# Altium footprint library SMD Passive.PcbLib: 136 footprints (part 4 of 9)
Each footprint in its own frame and in the unit in brackets; x right, y up, seen from the top. Pads: shape width x height; smd on the part's side, far side on the other; paste and mask are expansions set on the pad; w line width, h text height; cw(c..) or ccw(c..) is an arc to the next point about the centre after c.
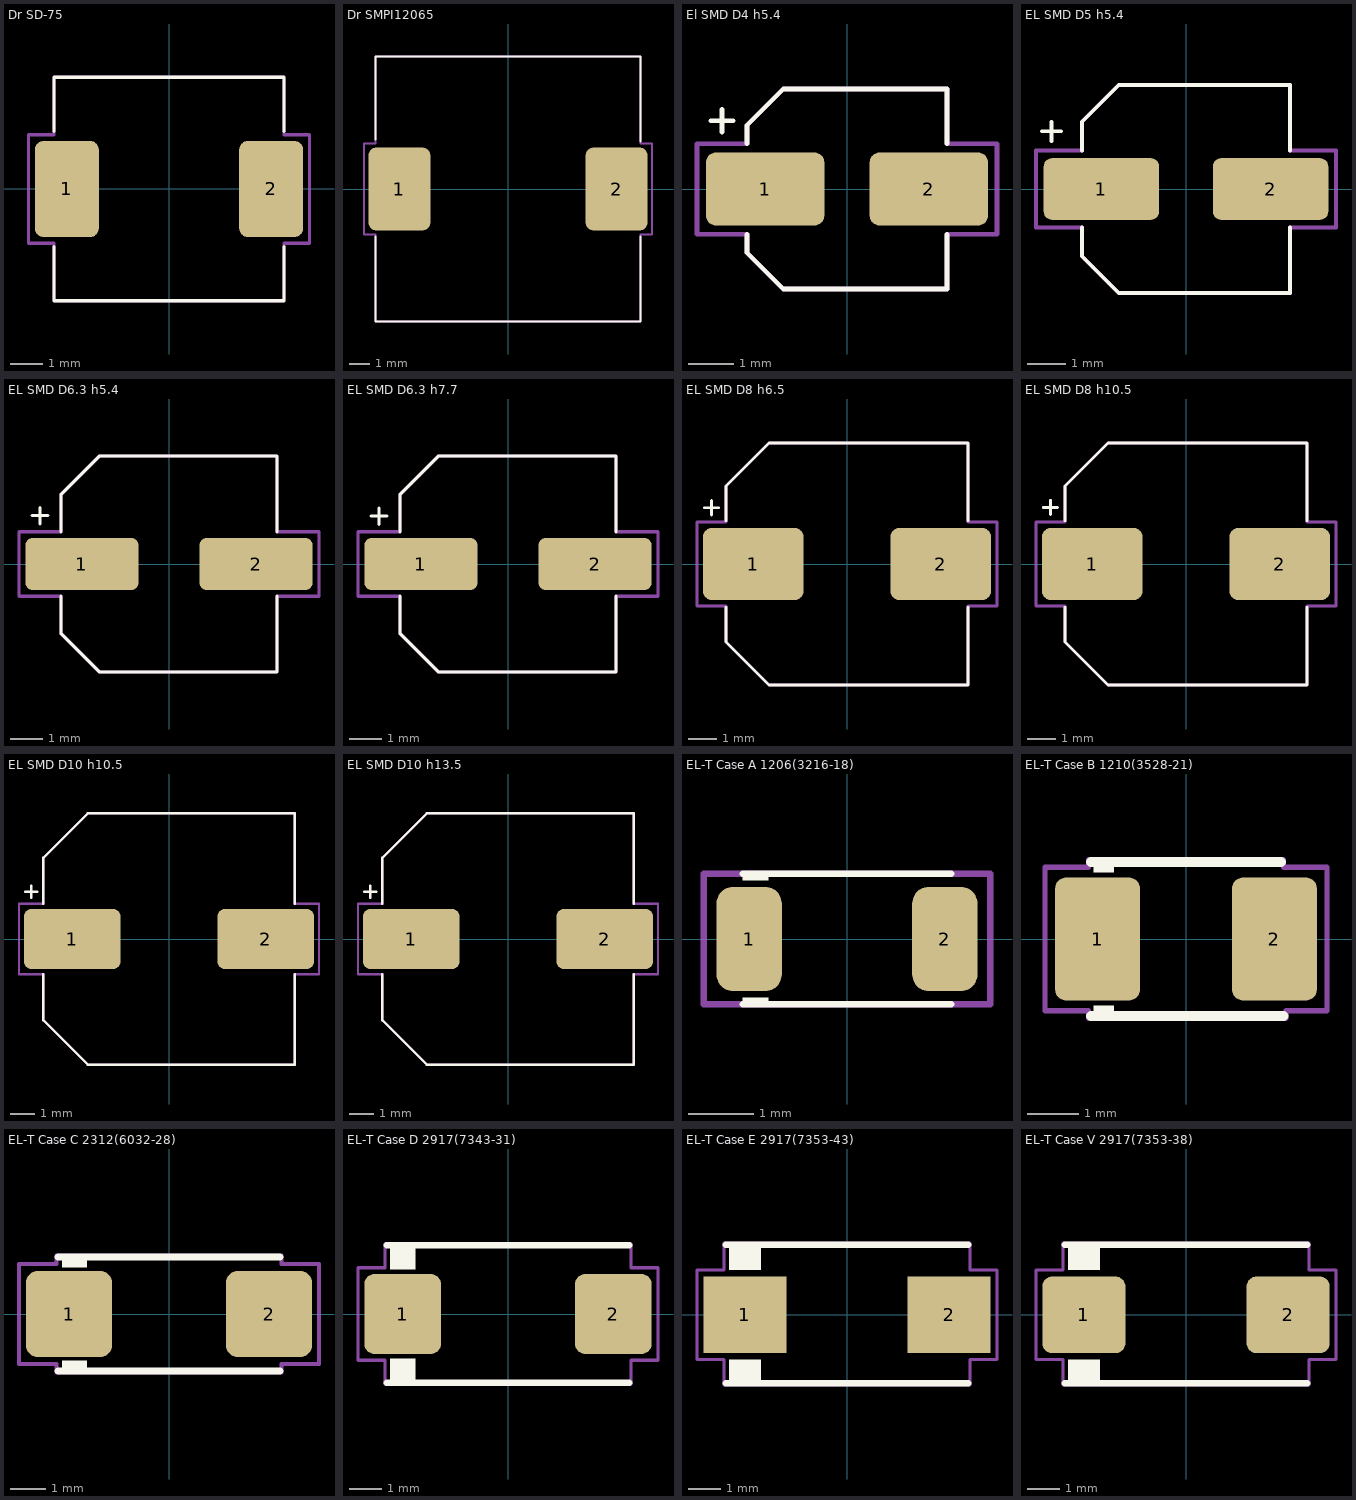
[diagram p3: the footprints below, top view; thin cyan lines are the x and y axes]

## Dr SD-75 [mm] "7.3x7.3x5mm"
height 5
pads (2):
  rrect25% 2x3 smd: 1(-3.2,0) 2(3.2,0)
Top Overlay:
  lines w0.1: -3.6,-1.8 -3.6,-3.5 3.6,-3.5 3.6,-1.8 ; -3.6,1.8 -3.6,3.5 3.6,3.5 3.6,1.8
Top Courtyard:
  lines w0.1: -3.6,3.494 -3.6,1.7 -4.4,1.7 -4.4,-1.7 -3.6,-1.7 -3.6,-3.5 3.6,-3.5 3.6,-1.7 4.4,-1.7 4.4,1.7 3.6,1.7 3.6,3.5 -3.6,3.5
3D body "Dr SMD SLF7045T.STEP": height 4.61, standoff 0, extent -3.6,-3.5 3.6,3.5

## Dr SMPI12065 [mm]
pads (2):
  rrect25% 3x4 smd: 1(-5.25,0) 2(5.25,0)
Top Overlay:
  lines w0.1: -6.4,-2.3 -6.4,-6.4 6.4,-6.4 6.4,-2.3 ; -6.4,2.4 -6.4,6.4 6.4,6.4 6.4,2.3
Top Courtyard:
  lines w0.1: -6.95,-2.2 -6.4,-2.2 -6.4,-6.4 6.4,-6.4 6.4,-2.2 6.95,-2.2 6.95,2.2 6.4,2.2 6.4,6.4 -6.4,6.4 -6.4,2.2 -6.95,2.2 -6.95,-2.2
3D body "AX02-30.STEP": height 5.99, standoff 0, extent -7.487,-6.639 7.487,6.655

## El SMD D4 h5.4 [mm]
height 5.4
pads (2):
  rrect25% 2.6x1.6 smd mask+0.102: 1(-1.8,0) 2(1.8,0)
Top Overlay:
  lines w0.1: -3,1.5 -2.5,1.5 ; -2.75,1.25 -2.75,1.75 ; -2.2,-1 -2.2,-1.4 -1.4,-2.2 2.2,-2.2 2.2,-1 ; -2.2,1 -2.2,1.4 -1.4,2.2 2.2,2.2 2.2,1
Top Courtyard:
  lines w0.1: -3.3,-1 -2.2,-1 -2.2,-1.4 -1.4,-2.2 2.2,-2.2 2.2,-1 3.3,-1 3.3,1 2.2,1 2.2,2.2 -1.4,2.2 -2.2,1.4 -2.2,1 -3.3,1 -3.3,-1
3D body "Cap EL SMD D4 h5.4.STEP": height 5.8, standoff 0, extent -2.5,-2.15 2.5,2.15

## EL SMD D5 h5.4 [mm]
height 5.4
pads (2):
  rrect25% 3x1.6 smd mask+0.102: 1(-2.2,0) 2(2.2,0)
Top Overlay:
  lines w0.1: -3.75,1.5 -3.25,1.5 ; -3.5,1.25 -3.5,1.75 ; -2.7,-1 -2.7,-1.75 -1.75,-2.7 2.7,-2.7 2.7,-1 ; -2.7,1 -2.7,1.75 -1.75,2.7 2.7,2.7 2.7,1
Top Courtyard:
  lines w0.1: -3.9,-1 -2.7,-1 -2.7,-1.75 -1.75,-2.7 2.7,-2.7 2.7,-1 3.9,-1 3.9,1 2.7,1 2.7,2.7 -1.75,2.7 -2.7,1.75 -2.7,1 -3.9,1 -3.9,-1
3D body "Cap EL SMD D5 h5.4.STEP": height 5.8, standoff 0, extent -2.9,-2.65 2.9,2.65

## EL SMD D6.3 h5.4 [mm]
height 5.4
pads (2):
  rrect25% 3.5x1.6 smd mask+0.102: 1(-2.7,0) 2(2.7,0)
Top Overlay:
  lines w0.1: -4.25,1.5 -3.75,1.5 ; -4,1.25 -4,1.75 ; -3.35,-1 -3.35,-2.15 -2.15,-3.35 3.35,-3.35 3.35,-1 ; -3.35,1 -3.35,2.15 -2.15,3.35 3.35,3.35 3.35,1
Top Courtyard:
  lines w0.1: -4.65,-1 -3.35,-1 -3.35,-2.15 -2.15,-3.35 3.35,-3.35 3.35,-1 4.65,-1 4.65,1 3.35,1 3.35,3.35 -2.15,3.35 -3.35,2.15 -3.35,1 -4.65,1 -4.65,-1
3D body "Cap EL SMD D6.3 h5.4.STEP": height 5.8, standoff 0, extent -3.6,-3.3 3.6,3.3

## EL SMD D6.3 h7.7 [mm]
height 5.4
pads (2):
  rrect25% 3.5x1.6 smd mask+0.102: 1(-2.7,0) 2(2.7,0)
Top Overlay:
  lines w0.1: -4.25,1.484 -3.75,1.484 ; -4,1.234 -4,1.734 ; -3.35,-1 -3.35,-2.15 -2.15,-3.35 3.35,-3.35 3.35,-1 ; -3.35,1 -3.35,2.15 -2.15,3.35 3.35,3.35 3.35,1
Top Courtyard:
  lines w0.1: -4.65,-1 -3.35,-1 -3.35,-2.15 -2.15,-3.35 3.35,-3.35 3.35,-1 4.65,-1 4.65,1 3.35,1 3.35,3.35 -2.15,3.35 -3.35,2.15 -3.35,1 -4.65,1 -4.65,-1
3D body "Cap EL SMD D6.3 h7.7.STEP": height 7.7, standoff 0, extent -3.6,-3.3 3.6,3.3

## EL SMD D8 h6.5 [mm]
height 6.5
pads (2):
  rrect25% 3.5x2.5 smd mask+0.102: 1(-3.25,0) 2(3.25,0)
Top Overlay:
  lines w0.1: -4.95,1.95 -4.45,1.95 ; -4.7,1.7 -4.7,2.2 ; -4.2,-1.5 -4.2,-2.7 -2.7,-4.2 4.2,-4.2 4.2,-1.5 ; -4.2,1.5 -4.2,2.7 -2.7,4.2 4.2,4.2 4.2,1.5
Top Courtyard:
  lines w0.1: -5.2,-1.45 -5.2,1.45 -4.2,1.45 -4.2,2.7 -2.7,4.2 4.2,4.2 4.2,1.45 5.2,1.45 5.2,-1.45 4.2,-1.45 4.2,-4.2 -2.7,-4.2 -4.2,-2.7 -4.2,-1.45 -5.2,-1.45
3D body "Cap EL SMD D8 h6.5.STEP": height 6.8, standoff 0, extent -4.5,-4.15 4.5,4.15

## EL SMD D8 h10.5 [mm]
height 10.5
pads (2):
  rrect25% 3.5x2.5 smd mask+0.102: 1(-3.25,0) 2(3.25,0)
Top Overlay:
  lines w0.1: -4.95,1.96 -4.45,1.96 ; -4.7,1.71 -4.7,2.21 ; -4.2,-1.5 -4.2,-2.7 -2.7,-4.2 4.2,-4.2 4.2,-1.5 ; -4.2,1.5 -4.2,2.7 -2.7,4.2 4.2,4.2 4.2,1.5
Top Courtyard:
  lines w0.1: -5.2,-1.45 -5.2,1.45 -4.2,1.45 -4.2,2.7 -2.7,4.2 4.2,4.2 4.2,1.45 5.2,1.45 5.2,-1.45 4.2,-1.45 4.2,-4.2 -2.7,-4.2 -4.2,-2.7 -4.2,-1.45 -5.2,-1.45
3D body "Cap EL SMD D8 h10.5.STEP": height 10.8, standoff 0, extent -4.5,-4.15 4.5,4.15

## EL SMD D10 h10.5 [mm]
height 10.5
pads (2):
  rrect25% 4x2.5 smd mask+0.102: 1(-4,0) 2(4,0)
Top Overlay:
  lines w0.1: -5.95,1.95 -5.45,1.95 ; -5.7,1.7 -5.7,2.2 ; -5.2,-1.45 -5.2,-3.35 -3.35,-5.2 5.2,-5.2 5.2,-1.45 ; -5.2,1.45 -5.2,3.35 -3.35,5.2 5.2,5.2 5.2,1.45
Top Courtyard:
  lines w0.1: -6.2,-1.45 -6.2,1.45 -5.2,1.45 -5.2,3.35 -3.35,5.2 5.2,5.2 5.2,1.45 6.2,1.45 6.2,-1.45 5.2,-1.45 5.2,-5.2 -3.35,-5.2 -5.2,-3.35 -5.2,-1.45 -6.2,-1.45
3D body "Cap EL SMD D10 h10.5.STEP": height 10.8, standoff 0, extent -5.5,-5.15 5.5,5.15

## EL SMD D10 h13.5 [mm]
height 13.5
pads (2):
  rrect25% 4x2.5 smd mask+0.102: 1(-4,0) 2(4,0)
Top Overlay:
  lines w0.1: -5.95,1.95 -5.45,1.95 ; -5.7,1.7 -5.7,2.2 ; -5.2,-1.45 -5.2,-3.35 -3.35,-5.2 5.2,-5.2 5.2,-1.45 ; -5.2,1.45 -5.2,3.35 -3.35,5.2 5.2,5.2 5.2,1.45
Top Courtyard:
  lines w0.1: -6.2,-1.45 -6.2,1.45 -5.2,1.45 -5.2,3.35 -3.35,5.2 5.2,5.2 5.2,1.45 6.2,1.45 6.2,-1.45 5.2,-1.45 5.2,-5.2 -3.35,-5.2 -5.2,-3.35 -5.2,-1.45 -6.2,-1.45
3D body "Cap EL SMD D10 h13.5.STEP": height 13.8, standoff 0, extent -5.5,-5.15 5.5,5.15

## EL-T Case A 1206(3216-18) [mm] "Capacitor, SM Tantalum; Body 3.2 x 1.8 mm (LxW typ)"
height 1.8
pads (2):
  rrect50% 1x1.6 smd: 1(-1.5,0) 2(1.5,0)
Top Overlay:
  rectangle: -1.6,0.9 -1.2,1
  rectangle: -1.6,-1 -1.2,-0.9
  lines w0.1: -1.6,-1 1.6,-1 ; -1.6,1 1.6,1
Top Courtyard:
  lines w0.1: -2.2,-1 2.2,-1 2.2,1 -2.2,1 -2.2,-1
3D body "EL-T SMD Case A 1206(3216-1.8).STEP": height 1.61, standoff 0, extent -1.595,-0.8 1.595,0.8

## EL-T Case B 1210(3528-21) [mm] "Capacitor, SM Tantalum; Body 3.5 x 2.1 mm (LxW typ)"
height 2.1
pads (2):
  rrect25% 1.65x2.4 smd: 1(-1.725,0) 2(1.725,0)
Top Overlay:
  rectangle: -1.8,1.3 -1.4,1.4
  rectangle: -1.8,-1.4 -1.4,-1.3
  lines w0.2: -1.85,-1.5 1.9,-1.5 ; -1.85,1.5 1.85,1.5
Top Courtyard:
  lines w0.1: -2.75,-1.4 -2.75,1.4 -1.9,1.4 -1.9,1.55 1.9,1.55 1.9,1.4 2.75,1.4 2.75,-1.4 1.95,-1.4 1.95,-1.55 -1.9,-1.55 -1.9,-1.4 -2.75,-1.4
3D body "EL-T SMD Case B 1210(3228-2.1).STEP": height 1.91, standoff 0, extent -1.746,-1.4 1.746,1.4

## EL-T Case C 2312(6032-28) [mm] "Capacitor, SM Tantalum; Body 6.0 x 2.8 mm (LxW typ)"
height 2.8
pads (2):
  rrect25% 2.4x2.4 smd: 1(-2.8,0) 2(2.8,0)
Top Overlay:
  rectangle: -3,-1.5 -2.3,-1.3
  rectangle: -3,1.3 -2.3,1.5
  lines w0.2: -3.1,-1.6 3.1,-1.6 ; -3.1,1.6 3.1,1.6
Top Courtyard:
  lines w0.1: -4.2,-1.4 -4.2,1.4 -3.15,1.4 -3.15,1.65 3.15,1.65 3.15,1.4 4.2,1.4 4.2,-1.4 3.15,-1.4 3.15,-1.65 -3.15,-1.65 -3.15,-1.4 -4.2,-1.4
3D body "EL-T SMD Case C 2312(6032-2.8).STEP": height 2.51, standoff 0, extent -2.997,-1.6 2.997,1.6

## EL-T Case D 2917(7343-31) [mm] "Capacitor, SM Tantalum; Body 7.3 x 3.1 mm (LxW typ)"
height 3.1
pads (2):
  rrect25% 2.4x2.5 smd: 1(-3.3,0) 2(3.3,0)
Top Overlay:
  rectangle: -3.7,1.4 -2.9,2.05
  rectangle: -3.7,-2.05 -2.9,-1.4
  lines w0.2: -3.8,-2.15 3.8,-2.15 ; -3.8,2.15 3.8,2.15
Top Courtyard:
  lines w0.1: -4.7,-1.45 -3.85,-1.45 -3.85,-2.2 3.85,-2.2 3.85,-1.45 4.7,-1.45 4.7,1.45 3.85,1.45 3.85,2.2 -3.85,2.2 -3.85,1.45 -4.7,1.45 -4.7,-1.45
3D body "EL-T SMD Case D 2917(7343-3.1).STEP": height 2.81, standoff 0, extent -3.647,-2.15 3.647,2.15

## EL-T Case E 2917(7353-43) [mm] "Capacitor, SM Tantalum; Body 7.3 x 4.3 mm (LxW typ)"
height 4.3
pads (2):
  rect 2.6x2.4 smd: 1(-3.2,0) 2(3.2,0)
Top Overlay:
  rectangle: -3.7,1.4 -2.7,2.1
  rectangle: -3.7,-2.05 -2.7,-1.4
  lines w0.2: -3.8,-2.15 3.8,-2.15 ; -3.8,2.2 3.8,2.2
Top Courtyard:
  lines w0.1: -4.7,-1.4 -3.85,-1.4 -3.85,-2.2 3.85,-2.2 3.85,-1.4 4.7,-1.4 4.7,1.4 3.85,1.4 3.85,2.25 -3.85,2.25 -3.85,1.4 -4.7,1.4 -4.7,-1.4
3D body "EL-T SMD Case E 2917(7343-4.3).STEP": height 4.11, standoff 0, extent -3.647,-2.15 3.647,2.15

## EL-T Case V 2917(7353-38) [mm] "Capacitor, SM Tantalum; Body 7.3 x 3.8 mm (LxW typ)"
height 3.8
pads (2):
  rrect25% 2.6x2.4 smd: 1(-3.2,0) 2(3.2,0)
Top Overlay:
  rectangle: -3.7,1.4 -2.7,2.1
  rectangle: -3.7,-2.05 -2.7,-1.4
  lines w0.2: -3.8,-2.15 3.8,-2.15 ; -3.8,2.2 3.8,2.2
Top Courtyard:
  lines w0.1: -4.7,-1.4 -3.85,-1.4 -3.85,-2.2 3.85,-2.2 3.85,-1.4 4.7,-1.4 4.7,1.4 3.85,1.4 3.85,2.25 -3.85,2.25 -3.85,1.4 -4.7,1.4 -4.7,-1.4
3D body "EL-T SMD Case V 2917(7343-2.0).STEP": height 2.01, standoff 0, extent -3.646,-2.15 3.646,2.15